# Altium footprint library 2.54插件排针.PcbLib: 91 footprints (part 1 of 6)
Each footprint in its own frame and in the unit in brackets; x right, y up, seen from the top. Pads: shape width x height; smd on the part's side, far side on the other; paste and mask are expansions set on the pad; w line width, h text height; cw(c..) or ccw(c..) is an arc to the next point about the centre after c.
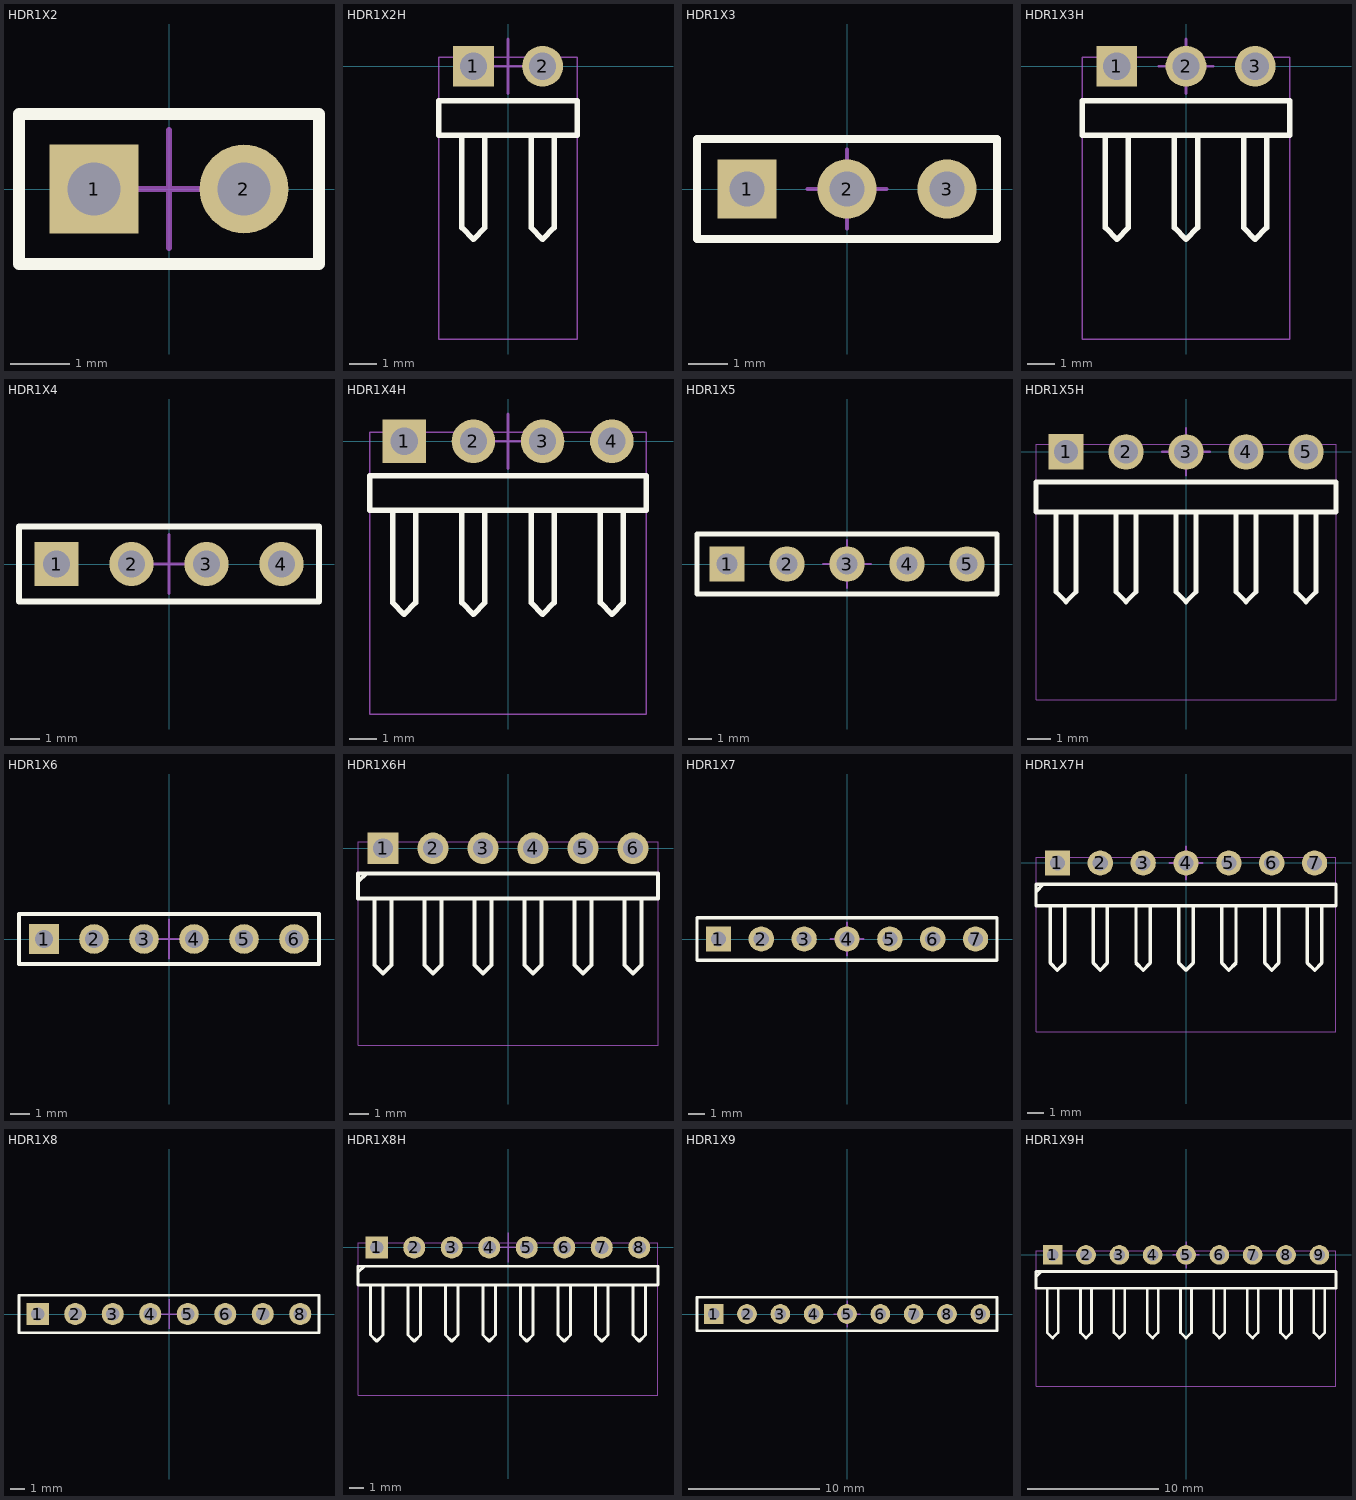
[diagram p0: the footprints below, top view; thin cyan lines are the x and y axes]

## HDR1X2 [mm] "Connector; Header; 2 Position"
pads (2):
  rect 1.5x1.5 hole 0.9: 1(-1.27,0)
  round 1.5 hole 0.9: 2(1.27,0)
Top Overlay:
  lines w0.2: -2.54,-1.27 -2.54,1.27 2.54,1.27 2.54,-1.27 -2.54,-1.27
Mechanical 13:
  lines w0.01: -2.54,-1.245 2.54,-1.245 2.54,1.255 -2.54,1.255 -2.54,-1.245
Mechanical 15:
  lines w0.1: -1,0 1,0 ; 0,-1 0,1
3D body "sip254p-2v.stp": height 9.01, standoff -2.99, extent -2.54,-1.245 2.54,1.255

## HDR1X2H [mm] "Connector; Header; 2 Position; Right Angle"
pads (2):
  rect 1.5x1.5 hole 1: 1(-1.27,0)
  round 1.5 hole 1: 2(1.27,0)
Top Overlay:
  lines w0.2: -1.693,-2.54 -1.693,-5.927 -1.27,-6.35 -0.847,-5.927 -0.847,-2.54 ; 0.847,-2.54 0.847,-5.927 1.27,-6.35 1.693,-5.927 1.693,-2.54 ; -2.54,-2.54 2.54,-2.54 2.54,-1.27 -2.54,-1.27 -2.54,-2.54
Mechanical 13:
  lines w0.05: -2.54,-10.01 2.54,-10.01 2.54,0.33 -2.54,0.33 -2.54,-10.01
Mechanical 15:
  lines w0.1: -1,0 1,0 ; 0,-1 0,1
3D body "sip254p-2h.stp": height 2.51, standoff -2.99, extent -2.54,-10.01 2.54,0.33

## HDR1X3 [mm] "Connector; Header; 3 Position"
pads (3):
  rect 1.5x1.5 hole 0.9: 1(-2.54,0)
  round 1.5 hole 0.9: 2(0,0) 3(2.54,0)
Top Overlay:
  lines w0.2: -3.81,-1.27 -3.81,1.27 3.81,1.27 3.81,-1.27 -3.81,-1.27
Mechanical 13:
  lines w0.02: -3.81,-1.25 3.81,-1.25 3.81,1.25 -3.81,1.25 -3.81,-1.25
Mechanical 15:
  lines w0.1: -1,0 1,0 ; 0,-1 0,1
3D body "sip254p-3v.stp": height 9.01, standoff -2.99, extent -3.81,-1.25 3.81,1.25

## HDR1X3H [mm] "Connector; Header; 3 Position; Right Angle"
pads (3):
  rect 1.5x1.5 hole 1: 1(-2.54,0)
  round 1.5 hole 1: 2(0,0) 3(2.54,0)
Top Overlay:
  lines w0.2: -2.963,-2.54 -2.963,-5.927 -2.54,-6.35 -2.117,-5.927 -2.117,-2.54 ; -0.423,-2.54 -0.423,-5.927 0,-6.35 0.423,-5.927 0.423,-2.54 ; 2.117,-2.54 2.117,-5.927 2.54,-6.35 2.963,-5.927 2.963,-2.54 ; -3.81,-2.54 3.81,-2.54 3.81,-1.27 -3.81,-1.27 -3.81,-2.54
Mechanical 13:
  lines w0.05: -3.81,-10.01 3.81,-10.01 3.81,0.33 -3.81,0.33 -3.81,-10.01
Mechanical 15:
  lines w0.1: -1,0 1,0 ; 0,-1 0,1
3D body "sip254p-3h.stp": height 2.51, standoff -2.99, extent -3.81,-10.01 3.81,0.33

## HDR1X4 [mm] "Connector; Header; 4 Position"
pads (4):
  rect 1.5x1.5 hole 0.9: 1(-3.81,0)
  round 1.5 hole 0.9: 2(-1.27,0) 3(1.27,0) 4(3.81,0)
Top Overlay:
  lines w0.2: -5.08,-1.27 -5.08,1.27 5.08,1.27 5.08,-1.27 -5.08,-1.27
Mechanical 13:
  lines w0.05: -5.08,-1.25 5.08,-1.25 5.08,1.25 -5.08,1.25 -5.08,-1.25
Mechanical 15:
  lines w0.1: -1,0 1,0 ; 0,-1 0,1
3D body "sip254p-4v.stp": height 9.05, standoff -2.95, extent -5.08,-1.25 5.08,1.25

## HDR1X4H [mm] "Connector; Header; 4 Position; Right Angle"
pads (4):
  rect 1.6x1.6 hole 1: 1(-3.81,0)
  round 1.6 hole 1: 2(-1.27,0) 3(1.27,0) 4(3.81,0)
Top Overlay:
  lines w0.2: -4.233,-2.54 -4.233,-5.927 -3.81,-6.35 -3.387,-5.927 -3.387,-2.54 ; -1.693,-2.54 -1.693,-5.927 -1.27,-6.35 -0.847,-5.927 -0.847,-2.54 ; 0.847,-2.54 0.847,-5.927 1.27,-6.35 1.693,-5.927 1.693,-2.54 ; 3.387,-2.54 3.387,-5.927 3.81,-6.35 4.233,-5.927 4.233,-2.54 ; -5.08,-2.54 -5.08,-1.27 5.08,-1.27 5.08,-2.54 -5.08,-2.54
Mechanical 13:
  lines w0.05: -5.08,-10.01 -5.08,0.33 5.08,0.33 5.08,-10.01 -5.08,-10.01
Mechanical 15:
  lines w0.1: -1,0 1,0 ; 0,-1 0,1
3D body "sip254p-4h.stp": height 2.51, standoff -2.99, extent -5.08,-10.01 5.08,0.33

## HDR1X5 [mm] "Connector; Header; 5 Position"
pads (5):
  rect 1.5x1.5 hole 0.9: 1(-5.08,0)
  round 1.5 hole 0.9: 2(-2.54,0) 3(0,0) 4(2.54,0) 5(5.08,0)
Top Overlay:
  lines w0.2: -6.35,-1.27 6.35,-1.27 6.35,1.27 -6.35,1.27 -6.35,-1.27
Mechanical 13:
  lines w0.05: -6.35,-1.23 -6.35,1.27 6.35,1.27 6.35,-1.23 -6.35,-1.23
Mechanical 15:
  lines w0.1: -1,0 1,0 ; 0,-1 0,1
3D body "sip254p-5v.stp": height 9.05, standoff -2.95, extent -6.35,-1.23 6.35,1.27

## HDR1X5H [mm] "Connector; Header; 5 Position; Right Angle"
pads (5):
  rect 1.5x1.5 hole 1: 1(-5.08,0)
  round 1.5 hole 1: 2(-2.54,0) 3(0,0) 4(2.54,0) 5(5.08,0)
Top Overlay:
  lines w0.2: -5.503,-2.54 -5.503,-5.927 -5.08,-6.35 -4.657,-5.927 -4.657,-2.54 ; -2.963,-2.54 -2.963,-5.927 -2.54,-6.35 -2.117,-5.927 -2.117,-2.54 ; -0.423,-2.54 -0.423,-5.927 0,-6.35 0.423,-5.927 0.423,-2.54 ; 2.117,-2.54 2.117,-5.927 2.54,-6.35 2.963,-5.927 2.963,-2.54 ; 4.657,-2.54 4.657,-5.927 5.08,-6.35 5.503,-5.927 5.503,-2.54 ; -6.35,-2.54 -6.35,-1.27 6.35,-1.27 6.35,-2.54 -6.35,-2.54
Mechanical 13:
  lines w0.05: -6.35,-10.49 -6.35,0.33 6.35,0.33 6.35,-10.49 -6.35,-10.49
Mechanical 15:
  lines w0.1: -1,0 1,0 ; 0,-1 0,1
3D body "sip254p-5h.stp": height 2.51, standoff -2.99, extent -6.35,-10.49 6.35,0.33

## HDR1X6 [mm] "Connector; Header; 6 Position"
pads (6):
  rect 1.5x1.5 hole 0.9: 1(-6.35,0)
  round 1.5 hole 0.9: 2(-3.81,0) 3(-1.27,0) 4(1.27,0) 5(3.81,0) 6(6.35,0)
Top Overlay:
  lines w0.2: -7.62,-1.27 -7.62,1.27 7.62,1.27 7.62,-1.27 -7.62,-1.27
Mechanical 13:
  lines w0.05: -7.62,-1.23 7.62,-1.23 7.62,1.27 -7.62,1.27 -7.62,-1.23
Mechanical 15:
  lines w0.1: -1,0 1,0 ; 0,-1 0,1
3D body "sip254p-6v.stp": height 9.05, standoff -2.95, extent -7.62,-1.23 7.62,1.27

## HDR1X6H [mm] "Connector; Header; 6 Position; Right Angle"
pads (6):
  rect 1.6x1.6 hole 1: 1(-6.35,0)
  round 1.6 hole 1: 2(-3.81,0) 3(-1.27,0) 4(1.27,0) 5(3.81,0) 6(6.35,0)
Top Overlay:
  lines w0.2: -7.62,-1.693 -7.197,-1.27 ; -6.773,-2.54 -6.773,-5.927 -6.35,-6.35 -5.927,-5.927 -5.927,-2.54 ; -4.233,-2.54 -4.233,-5.927 -3.81,-6.35 -3.387,-5.927 -3.387,-2.54 ; -1.693,-2.54 -1.693,-5.927 -1.27,-6.35 -0.847,-5.927 -0.847,-2.54 ; 0.847,-2.54 0.847,-5.927 1.27,-6.35 1.693,-5.927 1.693,-2.54 ; 3.387,-2.54 3.387,-5.927 3.81,-6.35 4.233,-5.927 4.233,-2.54 ; 5.927,-2.54 5.927,-5.927 6.35,-6.35 6.773,-5.927 6.773,-2.54 ; -7.62,-2.54 -7.62,-1.27 7.62,-1.27 7.62,-2.54 -7.62,-2.54
Mechanical 13:
  lines w0.05: -7.62,-10.01 7.62,-10.01 7.62,0.33 -7.62,0.33 -7.62,-10.01
3D body "sip254p-6h.stp": height 2.51, standoff -2.99, extent -7.62,-10.01 7.62,0.33

## HDR1X7 [mm] "Connector; Header; 7 Position"
pads (7):
  rect 1.5x1.5 hole 0.9: 1(-7.62,0)
  round 1.5 hole 0.9: 2(-5.08,0) 3(-2.54,0) 4(0,0) 5(2.54,0) 6(5.08,0) 7(7.62,0)
Top Overlay:
  lines w0.2: -8.89,-1.27 8.89,-1.27 8.89,1.27 -8.89,1.27 -8.89,-1.27
Mechanical 13:
  lines w0.05: -8.89,-1.23 8.89,-1.23 8.89,1.27 -8.89,1.27 -8.89,-1.23
Mechanical 15:
  lines w0.1: -1,0 1,0 ; 0,-1 0,1
3D body "sip254p-7v.stp": height 9.05, standoff -2.95, extent -8.89,-1.23 8.89,1.27

## HDR1X7H [mm] "Connector; Header; 7 Position; Right Angle"
pads (7):
  rect 1.5x1.5 hole 0.9: 1(-7.62,0)
  round 1.5 hole 0.9: 2(-5.08,0) 3(-2.54,0) 4(0,0) 5(2.54,0) 6(5.08,0) 7(7.62,0)
Top Overlay:
  lines w0.2: -8.89,-1.693 -8.467,-1.27 ; -8.043,-2.54 -8.043,-5.927 -7.62,-6.35 -7.197,-5.927 -7.197,-2.54 ; -5.503,-2.54 -5.503,-5.927 -5.08,-6.35 -4.657,-5.927 -4.657,-2.54 ; -2.963,-2.54 -2.963,-5.927 -2.54,-6.35 -2.117,-5.927 -2.117,-2.54 ; -0.423,-2.54 -0.423,-5.927 0,-6.35 0.423,-5.927 0.423,-2.54 ; 2.117,-2.54 2.117,-5.927 2.54,-6.35 2.963,-5.927 2.963,-2.54 ; 4.657,-2.54 4.657,-5.927 5.08,-6.35 5.503,-5.927 5.503,-2.54 ; 7.197,-2.54 7.197,-5.927 7.62,-6.35 8.043,-5.927 8.043,-2.54 ; -8.89,-2.54 8.89,-2.54 8.89,-1.27 -8.89,-1.27 -8.89,-2.54
Mechanical 13:
  lines w0.05: -8.89,-10.01 8.89,-10.01 8.89,0.33 -8.89,0.33 -8.89,-10.01
Mechanical 15:
  lines w0.1: -1,0 1,0 ; 0,-1 0,1
3D body "sip254p-7h.stp": height 2.51, standoff -2.99, extent -8.89,-10.01 8.89,0.33

## HDR1X8 [mm] "Connector; Header; 8 Position"
pads (8):
  rect 1.5x1.5 hole 0.9: 1(-8.89,0)
  round 1.5 hole 0.9: 2(-6.35,0) 3(-3.81,0) 4(-1.27,0) 5(1.27,0) 6(3.81,0) 7(6.35,0) 8(8.89,0)
Top Overlay:
  lines w0.2: -10.16,-1.27 10.16,-1.27 10.16,1.27 -10.16,1.27 -10.16,-1.27
Mechanical 13:
  lines w0.05: -10.16,-1.23 10.16,-1.23 10.16,1.27 -10.16,1.27 -10.16,-1.23
Mechanical 15:
  lines w0.1: -1,0 1,0 ; 0,-1 0,1
3D body "sip254p-8v.stp": height 9.05, standoff -2.95, extent -10.16,-1.23 10.16,1.27

## HDR1X8H [mm] "Connector; Header; 8 Position; Right Angle"
pads (8):
  rect 1.5x1.5 hole 0.9: 1(-8.89,0)
  round 1.5 hole 0.9: 2(-6.35,0) 3(-3.81,0) 4(-1.27,0) 5(1.27,0) 6(3.81,0) 7(6.35,0) 8(8.89,0)
Top Overlay:
  lines w0.2: -10.16,-1.693 -9.737,-1.27 ; -9.313,-2.54 -9.313,-5.927 -8.89,-6.35 -8.467,-5.927 -8.467,-2.54 ; -6.773,-2.54 -6.773,-5.927 -6.35,-6.35 -5.927,-5.927 -5.927,-2.54 ; -4.233,-2.54 -4.233,-5.927 -3.81,-6.35 -3.387,-5.927 -3.387,-2.54 ; -1.693,-2.54 -1.693,-5.927 -1.27,-6.35 -0.847,-5.927 -0.847,-2.54 ; 0.847,-2.54 0.847,-5.927 1.27,-6.35 1.693,-5.927 1.693,-2.54 ; 3.387,-2.54 3.387,-5.927 3.81,-6.35 4.233,-5.927 4.233,-2.54 ; 5.927,-2.54 5.927,-5.927 6.35,-6.35 6.773,-5.927 6.773,-2.54 ; 8.467,-2.54 8.467,-5.927 8.89,-6.35 9.313,-5.927 9.313,-2.54 ; -10.16,-2.54 10.16,-2.54 10.16,-1.27 -10.16,-1.27 -10.16,-2.54
Mechanical 13:
  lines w0.05: -10.16,-10.01 -10.16,0.33 10.16,0.33 10.16,-10.01 -10.16,-10.01
Mechanical 15:
  lines w0.1: -1,0 1,0 ; 0,-1 0,1
3D body "sip254p-8h.stp": height 2.51, standoff -2.99, extent -10.16,-10.01 10.16,0.33

## HDR1X9 [mm] "Connector; Header; 9 Position"
pads (9):
  rect 1.5x1.5 hole 0.9: 1(-10.16,0)
  round 1.5 hole 0.9: 2(-7.62,0) 3(-5.08,0) 4(-2.54,0) 5(0,0) 6(2.54,0) 7(5.08,0) 8(7.62,0) 9(10.16,0)
Top Overlay:
  lines w0.2: -11.43,-1.27 11.43,-1.27 11.43,1.27 -11.43,1.27 -11.43,-1.27
Mechanical 13:
  lines w0.05: -11.43,-1.23 11.43,-1.23 11.43,1.27 -11.43,1.27 -11.43,-1.23
Mechanical 15:
  lines w0.1: -1,0 1,0 ; 0,-1 0,1
3D body "sip254p-9v.stp": height 9.05, standoff -2.95, extent -11.43,-1.23 11.43,1.27

## HDR1X9H [mm] "Connector; Header; 9 Position; Right Angle"
pads (9):
  rect 1.5x1.5 hole 0.9: 1(-10.16,0)
  round 1.5 hole 0.9: 2(-7.62,0) 3(-5.08,0) 4(-2.54,0) 5(0,0) 6(2.54,0) 7(5.08,0) 8(7.62,0) 9(10.16,0)
Top Overlay:
  lines w0.2: -11.43,-1.693 -11.007,-1.27 ; -10.583,-2.54 -10.583,-5.927 -10.16,-6.35 -9.737,-5.927 -9.737,-2.54 ; -8.043,-2.54 -8.043,-5.927 -7.62,-6.35 -7.197,-5.927 -7.197,-2.54 ; -5.503,-2.54 -5.503,-5.927 -5.08,-6.35 -4.657,-5.927 -4.657,-2.54 ; -2.963,-2.54 -2.963,-5.927 -2.54,-6.35 -2.117,-5.927 -2.117,-2.54 ; -0.423,-2.54 -0.423,-5.927 0,-6.35 0.423,-5.927 0.423,-2.54 ; 2.117,-2.54 2.117,-5.927 2.54,-6.35 2.963,-5.927 2.963,-2.54 ; 4.657,-2.54 4.657,-5.927 5.08,-6.35 5.503,-5.927 5.503,-2.54 ; 7.197,-2.54 7.197,-5.927 7.62,-6.35 8.043,-5.927 8.043,-2.54 ; 9.737,-2.54 9.737,-5.927 10.16,-6.35 10.583,-5.927 10.583,-2.54 ; -11.43,-2.54 -11.43,-1.27 11.43,-1.27 11.43,-2.54 -11.43,-2.54
Mechanical 13:
  lines w0.05: -11.43,-10.01 -11.43,0.33 11.43,0.33 11.43,-10.01 -11.43,-10.01
Mechanical 15:
  lines w0.1: -1,0 1,0 ; 0,-1 0,1
3D body "sip254p-9h.stp": height 2.51, standoff -2.99, extent -11.43,-10.01 11.43,0.33